# Altium footprint library LEMO THD_OLD.PcbLib: 54 footprints (part 4 of 4)
Each footprint in its own frame and in the unit in brackets; x right, y up, seen from the top. Pads: shape width x height; smd on the part's side, far side on the other; paste and mask are expansions set on the pad; w line width, h text height; cw(c..) or ccw(c..) is an arc to the next point about the centre after c.
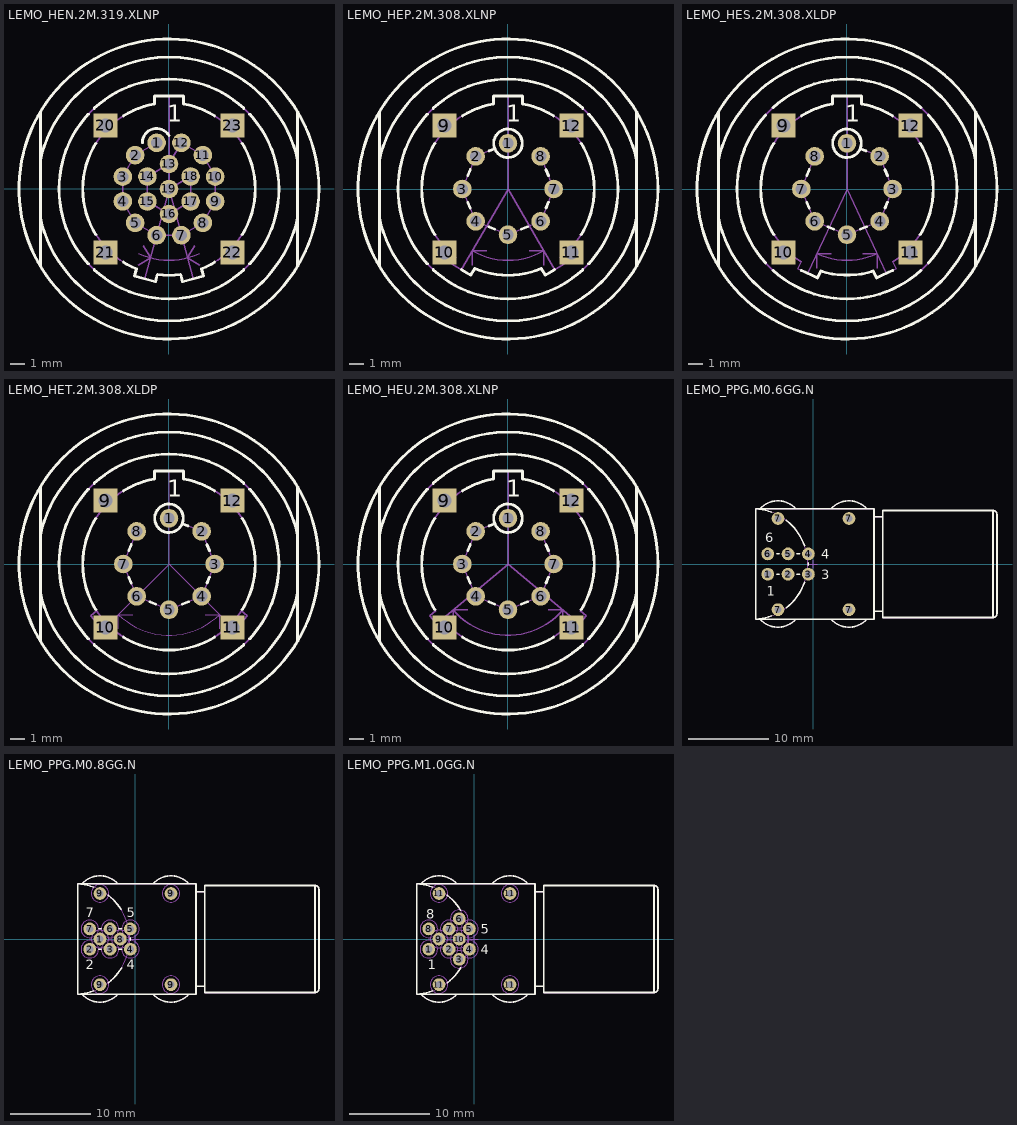
[diagram p3: the footprints below, top view; thin cyan lines are the x and y axes]

## LEMO_HEN.2M.319.XLNP [mm] "Size 2M, 19 Contacts Circular Watertight (IP 68) Receptacle, with Fixing Nut"
height 16.8
pads (23):
  round 1.3 hole 0.8: 1(-0.867,3.236) 2(-2.369,2.369) 3(-3.236,0.867) 4(-3.236,-0.867) 5(-2.369,-2.369) 6(-0.867,-3.236) 7(0.867,-3.236) 8(2.369,-2.369) 9(3.236,-0.867) 10(3.236,0.867) 11(2.369,2.369) 12(0.867,3.236) 13(0,1.75) 14(-1.516,0.875) 15(-1.516,-0.875) 16(0,-1.75) 17(1.516,-0.875) 18(1.516,0.875) 19(0,0)
  rect 1.7x1.7 hole 1: 20(-4.445,4.445) 21(-4.445,-4.445) 22(4.445,-4.445) 23(4.445,4.445)
Top Overlay:
  circle w0.2: c0,0 r10.5
  lines w0.2: -9,-5.408 -9,5.408 ; -9,-2.048 ccw(c0,0) 9,-2.048 ; -9,2.048 cw(c0,0) 9,2.048 ; -5.645,-5.237 cw(c0,0) -5.645,5.237 ; -5.237,-5.645 ccw(c0,0) 5.237,-5.645 ; -5.237,5.645 cw(c0,0) 5.237,5.645 ; -5.12,-3.195 cw(c0,0) -5.12,3.195 ; -3.195,-5.12 ccw(c0,0) -2.284,-5.586 -2.42,-6.096 -0.952,-6.49 -0.815,-5.98 ccw(c0,0) 0.815,-5.98 0.952,-6.49 2.42,-6.096 2.284,-5.586 ccw(c0,0) 3.195,-5.12 ; -3.195,5.12 cw(c0,0) -1.01,5.95 -1.01,6.515 1.01,6.515 1.01,5.95 cw(c0,0) 3.195,5.12 ; -1.867,3.234 cw(c-0.867,3.236) 0,3.734 ; 5.12,-3.195 ccw(c0,0) 5.12,3.195 ; 5.645,-5.237 ccw(c0,0) 5.645,5.237 ; 9,-5.408 9,5.408
  text "1" at -0.117,4.695 h1.2
Mechanical 2:
  text "BLUE" at -1.586,7.873 h1
Mechanical 8:
  lines w0.1: -4.945,-4.445 -4.445,-4.445 ; -4.945,4.445 -4.445,4.445 ; -4.445,-4.945 -4.445,-4.445 ; -4.445,-3.945 -4.445,-4.445 ; -4.445,3.945 -4.445,4.445 ; -4.445,4.945 -4.445,4.445 ; -3.945,-4.445 -4.445,-4.445 ; -3.945,4.445 -4.445,4.445 ; -3.736,-0.867 -3.236,-0.867 ; -3.736,0.867 -3.236,0.867 ; -3.236,-1.367 -3.236,-0.867 ; -3.236,-0.367 -3.236,-0.867 ; -3.236,0.367 -3.236,0.867 ; -3.236,1.367 -3.236,0.867 ; -2.869,-2.369 -2.369,-2.369 ; -2.869,2.369 -2.369,2.369 ; -2.736,-0.867 -3.236,-0.867 ; -2.736,0.867 -3.236,0.867 ; -2.369,-2.869 -2.369,-2.369 ; -2.369,-1.869 -2.369,-2.369 ; -2.369,1.869 -2.369,2.369 ; -2.369,2.869 -2.369,2.369 ; -2.16,-5.33 -1.294,-4.83 -1.794,-3.964 ; -2.113,-4.532 ccw(c0,0) 2.113,-4.532 ; -2.016,-0.875 -1.516,-0.875 ; -2.016,0.875 -1.516,0.875 ; -1.869,-2.369 -2.369,-2.369 ; -1.869,2.369 -2.369,2.369 ; -1.686,-6.293 0,0 ; -1.516,-1.375 -1.516,-0.875 ; -1.516,-0.375 -1.516,-0.875 ; -1.516,0.375 -1.516,0.875 ; -1.516,1.375 -1.516,0.875 ; -1.367,-3.236 -0.867,-3.236 ; -1.367,3.236 -0.867,3.236 ; -1.016,-0.875 -1.516,-0.875 ; -1.016,0.875 -1.516,0.875 ; -0.867,-3.736 -0.867,-3.236 ; -0.867,-2.736 -0.867,-3.236 ; -0.867,2.736 -0.867,3.236 ; -0.867,3.736 -0.867,3.236 ; -0.5,-1.75 0,-1.75 ; -0.5,0 0,0 ; -0.5,1.75 0,1.75 ; -0.367,-3.236 -0.867,-3.236 ; -0.367,3.236 -0.867,3.236 ; 0,-2.25 0,-1.75 ; 0,-1.25 0,-1.75 ; 0,-0.5 0,0 ; 0,0.5 0,0 ; 0,1.25 0,1.75 ; 0,2.25 0,1.75 ; 0,6.515 0,0 ; 0.367,-3.236 0.867,-3.236 ; 0.367,3.236 0.867,3.236 ; 0.5,-1.75 0,-1.75 ; 0.5,0 0,0 ; 0.5,1.75 0,1.75 ; 0.867,-3.736 0.867,-3.236 ; 0.867,-2.736 0.867,-3.236 ; 0.867,2.736 0.867,3.236 ; 0.867,3.736 0.867,3.236 ; 1.016,-0.875 1.516,-0.875 ; 1.016,0.875 1.516,0.875 ; 1.367,-3.236 0.867,-3.236 ; 1.367,3.236 0.867,3.236 ; 1.516,-1.375 1.516,-0.875 ; 1.516,-0.375 1.516,-0.875 ; 1.516,0.375 1.516,0.875 ; 1.516,1.375 1.516,0.875 ; 1.686,-6.293 0,0 ; 1.794,-3.964 1.294,-4.83 2.16,-5.33 ; 1.869,-2.369 2.369,-2.369 ; 1.869,2.369 2.369,2.369 ; 2.016,-0.875 1.516,-0.875 ; 2.016,0.875 1.516,0.875 ; 2.369,-2.869 2.369,-2.369 ; 2.369,-1.869 2.369,-2.369 ; 2.369,1.869 2.369,2.369 ; 2.369,2.869 2.369,2.369 ; 2.736,-0.867 3.236,-0.867 ; 2.736,0.867 3.236,0.867 ; 2.869,-2.369 2.369,-2.369 ; 2.869,2.369 2.369,2.369 ; 3.236,-1.367 3.236,-0.867 ; 3.236,-0.367 3.236,-0.867 ; 3.236,0.367 3.236,0.867 ; 3.236,1.367 3.236,0.867 ; 3.736,-0.867 3.236,-0.867 ; 3.736,0.867 3.236,0.867 ; 3.945,-4.445 4.445,-4.445 ; 3.945,4.445 4.445,4.445 ; 4.445,-4.945 4.445,-4.445 ; 4.445,-3.945 4.445,-4.445 ; 4.445,3.945 4.445,4.445 ; 4.445,4.945 4.445,4.445 ; 4.945,-4.445 4.445,-4.445 ; 4.945,4.445 4.445,4.445
  text "30" at -0.595,-4.879 h1
Mechanical 14:
  circle w0.1: c0,0 r0.55
  circle w0.1: c1.516,0.875 r0.55
  circle w0.1: c1.516,-0.875 r0.55
  circle w0.1: c0,-1.75 r0.55
  circle w0.1: c-1.516,-0.875 r0.55
  circle w0.1: c-1.516,0.875 r0.55
  circle w0.1: c0,1.75 r0.55
  circle w0.1: c0.867,3.236 r0.55
  circle w0.1: c2.369,2.369 r0.55
  circle w0.1: c3.236,0.867 r0.55
  circle w0.1: c3.236,-0.867 r0.55
  circle w0.1: c2.369,-2.369 r0.55
  circle w0.1: c0.867,-3.236 r0.55
  circle w0.1: c-0.867,-3.236 r0.55
  circle w0.1: c-2.369,-2.369 r0.55
  circle w0.1: c-3.236,-0.867 r0.55
  circle w0.1: c-3.236,0.867 r0.55
  circle w0.1: c-2.369,2.369 r0.55
  circle w0.1: c-0.867,3.236 r0.55
  circle w0.1: c0,0 r7.7
  circle w0.1: c0,0 r10.5
  lines w0.1: -9,-5.408 -9,5.408 ; -9,-2.048 ccw(c0,0) 9,-2.048 ; -9,2.048 cw(c0,0) 9,2.048 ; -3.236,-0.317 -3.236,0.317 ; -2.961,-1.343 -2.644,-1.893 ; -2.961,1.343 -2.644,1.892 ; -1.892,-2.644 -1.343,-2.961 ; -1.892,2.644 -1.343,2.961 ; -1.867,3.234 cw(c-0.867,3.236) 0,3.734 ; -1.516,-0.325 -1.516,0.325 ; -1.039,-1.15 -0.476,-1.475 ; -1.039,1.15 -0.476,1.475 ; -0.317,-3.236 0.317,-3.236 ; 0.277,2.225 0.59,2.761 ; 0.476,-1.475 1.039,-1.15 ; 0.476,0.275 1.039,0.6 ; 1.343,-2.961 1.892,-2.644 ; 1.343,2.961 1.892,2.644 ; 1.516,-0.325 1.516,0.325 ; 2.644,-1.893 2.961,-1.343 ; 2.644,1.892 2.961,1.343 ; 3.236,-0.317 3.236,0.317 ; 9,-5.408 9,5.408 ; -2.42,-6.096 -0.952,-6.49 -0.815,-5.98 ccw(c0,0) 0.815,-5.98 0.952,-6.49 2.42,-6.096 2.284,-5.586 ccw(c0,0) 1.01,5.95 1.01,6.515 -1.01,6.515 -1.01,5.95 ccw(c0,0) -2.284,-5.586 -2.42,-6.096
  text "1" at -0.117,4.695 h1.2
3D body "LEMO_HEN.2M.319.XLNP_Part2.stp": height 11.5, standoff 8.3, extent -10.5,-10.5 10.5,10.5
3D body "LEMO_HEN.2M.319.XLNP_Part1.stp": height 16.8, standoff -4, extent -10.4,-10.4 10.4,10.4

## LEMO_HEP.2M.308.XLNP [mm] "Size 2M, 8 Contacts Circular Watertight (IP 68) Receptacle, with Fixing Nut"
height 16.8
pads (12):
  round 1.3 hole 0.8: 1(0,3.2) 2(-2.263,2.286) 3(-3.2,0) 4(-2.263,-2.263) 5(0,-3.2) 6(2.286,-2.263) 7(3.2,0) 8(2.286,2.286)
  rect 1.7x1.7 hole 1: 9(-4.445,4.445) 10(-4.445,-4.445) 11(4.445,-4.445) 12(4.445,4.445)
Top Overlay:
  circle w0.2: c0,0 r10.5
  circle w0.2: c0,3.2 r1
  lines w0.2: -9,-5.408 -9,5.408 ; -9,-2.048 ccw(c0,0) 9,-2.048 ; -9,2.048 cw(c0,0) 9,2.048 ; -5.645,-5.237 cw(c0,0) -5.645,5.237 ; -5.237,-5.645 ccw(c0,0) 5.237,-5.645 ; -5.237,5.645 cw(c0,0) 5.237,5.645 ; -5.12,-3.195 cw(c0,0) -5.12,3.195 ; -3.257,-5.642 -2.599,-6.022 -2.335,-5.565 ccw(c0,0) 2.335,-5.565 2.599,-6.022 3.258,-5.642 ; -3.195,5.12 cw(c0,0) -1.01,5.95 -1.01,6.515 1.01,6.515 1.01,5.95 cw(c0,0) 3.195,5.12 ; -2.821,0.925 -2.642,1.361 ; -2.817,-0.924 -2.645,-1.339 ; -1.339,-2.645 -0.924,-2.817 ; -1.335,2.661 -0.927,2.826 ; 0.925,-2.821 1.361,-2.642 ; 2.657,1.358 2.829,0.928 ; 2.661,-1.336 2.826,-0.927 ; 5.12,-3.195 ccw(c0,0) 5.12,3.195 ; 5.645,-5.237 ccw(c0,0) 5.645,5.237 ; 9,-5.408 9,5.408
  text "1" at -0.117,4.695 h1.2
Mechanical 8:
  lines w0.1: -4.945,-4.445 -4.445,-4.445 ; -4.945,4.445 -4.445,4.445 ; -4.445,-4.945 -4.445,-4.445 ; -4.445,-3.945 -4.445,-4.445 ; -4.445,3.945 -4.445,4.445 ; -4.445,4.945 -4.445,4.445 ; -3.945,-4.445 -4.445,-4.445 ; -3.945,4.445 -4.445,4.445 ; -3.7,0 -3.2,0 ; -3.257,-5.642 0,0 ; -3.2,-0.5 -3.2,0 ; -3.2,0.5 -3.2,0 ; -2.763,-2.263 -2.263,-2.263 ; -2.763,2.286 -2.263,2.286 ; -2.7,0 -3.2,0 ; -2.5,-5.33 -2.5,-4.33 ; -2.263,-2.763 -2.263,-2.263 ; -2.263,-1.763 -2.263,-2.263 ; -2.263,1.786 -2.263,2.286 ; -2.263,2.786 -2.263,2.286 ; -1.763,-2.263 -2.263,-2.263 ; -1.763,2.286 -2.263,2.286 ; -1.5,-4.33 -2.5,-4.33 ; -0.5,-3.2 0,-3.2 ; -0.5,3.2 0,3.2 ; 0,-3.7 0,-3.2 ; 0,-2.7 0,-3.2 ; 0,2.7 0,3.2 ; 0,3.7 0,3.2 ; 0,6.515 0,0 ; 0.5,-3.2 0,-3.2 ; 0.5,3.2 0,3.2 ; 1.5,-4.33 2.5,-4.33 ; 1.786,-2.263 2.286,-2.263 ; 1.786,2.286 2.286,2.286 ; 2.286,-2.763 2.286,-2.263 ; 2.286,-1.763 2.286,-2.263 ; 2.286,1.786 2.286,2.286 ; 2.286,2.786 2.286,2.286 ; 2.5,-5.33 2.5,-4.33 ; 2.7,0 3.2,0 ; 2.786,-2.263 2.286,-2.263 ; 2.786,2.286 2.286,2.286 ; 3.2,-0.5 3.2,0 ; 3.2,0.5 3.2,0 ; 3.258,-5.642 0,0 ; 3.7,0 3.2,0 ; 3.945,-4.445 4.445,-4.445 ; 3.945,4.445 4.445,4.445 ; 4.445,-4.945 4.445,-4.445 ; 4.445,-3.945 4.445,-4.445 ; 4.445,3.945 4.445,4.445 ; 4.445,4.945 4.445,4.445 ; 4.945,-4.445 4.445,-4.445 ; 4.945,4.445 4.445,4.445 ; -2.5,-4.33 ccw(c0,0) 2.5,-4.33
  text "60" at -0.75,-4.9 h1
Mechanical 14:
  circle w0.1: c0,0 r10.5
  circle w0.1: c0,0 r7.7
  circle w0.1: c0,3.2 r1
  circle w0.1: c-2.263,2.286 r0.55
  circle w0.1: c-3.2,0 r0.55
  circle w0.1: c-2.263,-2.263 r0.55
  circle w0.1: c0,-3.2 r0.55
  circle w0.1: c2.286,-2.263 r0.55
  circle w0.1: c3.2,0 r0.55
  circle w0.1: c2.286,2.286 r0.55
  lines w0.1: -9,-5.408 -9,5.408 ; -9,-2.048 ccw(c0,0) 9,-2.048 ; -9,2.048 cw(c0,0) 9,2.048 ; -2.991,0.509 -2.471,1.777 ; -2.989,-0.508 -2.473,-1.755 ; -1.755,-2.473 -0.508,-2.99 ; -1.753,2.492 -0.927,2.826 ; 0.509,-2.991 1.777,-2.471 ; 2.49,1.775 2.996,0.511 ; 2.492,-1.753 2.994,-0.51 ; 9,-5.408 9,5.408 ; -3.916,-5.262 -3.652,-4.805 cw(c0,0) -1.01,5.95 -1.01,6.515 1.01,6.515 1.01,5.95 cw(c0,0) 3.652,-4.805 3.916,-5.262 2.599,-6.022 2.335,-5.565 cw(c0,0) -2.335,-5.565 -2.599,-6.022 -3.916,-5.262
  text "YELLOW" at -2.536,7.873 h0.8
  text "1" at -0.117,4.695 h1.2
3D body "LEMO_HEP.2M.308.XLNP_Part1.stp": height 16.8, standoff -4, extent -10.4,-10.4 10.4,10.4
3D body "LEMO_HEP.2M.308.XLNP_Part2.stp": height 11.5, standoff 8.3, extent -10.5,-10.5 10.5,10.5

## LEMO_HES.2M.308.XLDP [mm] "Size 2M, 8 Female Contacts Circular Watertight (IP 68) Receptacle, with Fixing Nut"
height 16.8
pads (12):
  round 1.3 hole 0.8: 1(0,3.2) 2(2.286,2.286) 3(3.2,0) 4(2.286,-2.263) 5(0,-3.2) 6(-2.263,-2.263) 7(-3.2,0) 8(-2.263,2.286)
  rect 1.7x1.7 hole 1: 9(-4.445,4.445) 10(-4.445,-4.445) 11(4.445,-4.445) 12(4.445,4.445)
Top Overlay:
  circle w0.2: c0,3.2 r1
  circle w0.2: c0,0 r10.5
  lines w0.2: -9,-5.408 -9,5.408 ; -9,-2.048 ccw(c0,0) 9,-2.048 ; -9,2.048 cw(c0,0) 9,2.048 ; -5.695,-5.182 cw(c0,0) -5.695,5.182 ; -5.182,-5.695 ccw(c0,0) 5.182,-5.695 ; -5.182,5.695 cw(c0,0) 5.182,5.695 ; -5.12,-3.195 cw(c0,0) -5.12,3.195 ; -3.203,-5.695 -2.065,-6.226 -1.841,-5.747 ccw(c0,0) 1.841,-5.747 2.065,-6.226 3.203,-5.695 ; -3.195,5.12 cw(c0,0) -1.01,5.95 -1.01,6.515 1.01,6.515 1.01,5.95 cw(c0,0) 3.195,5.12 ; -2.821,0.925 -2.642,1.361 ; -2.817,-0.924 -2.645,-1.339 ; -1.339,-2.645 -0.924,-2.817 ; 0.925,-2.821 1.361,-2.642 ; 0.927,2.826 1.336,2.661 ; 2.657,1.358 2.829,0.928 ; 2.661,-1.336 2.826,-0.927 ; 5.12,-3.195 ccw(c0,0) 5.12,3.195 ; 5.695,-5.182 ccw(c0,0) 5.695,5.182 ; 9,-5.408 9,5.408
  text "1" at -0.117,4.695 h1.2
Mechanical 2:
  text "RED" at -1.264,7.873 h1
Mechanical 8:
  lines w0.1: -4.945,-4.445 -4.445,-4.445 ; -4.945,4.445 -4.445,4.445 ; -4.445,-4.945 -4.445,-4.445 ; -4.445,-3.945 -4.445,-4.445 ; -4.445,3.945 -4.445,4.445 ; -4.445,4.945 -4.445,4.445 ; -3.945,-4.445 -4.445,-4.445 ; -3.945,4.445 -4.445,4.445 ; -3.7,0 -3.2,0 ; -3.2,-0.5 -3.2,0 ; -3.2,0.5 -3.2,0 ; -2.763,-2.263 -2.263,-2.263 ; -2.763,2.286 -2.263,2.286 ; -2.753,-5.905 0,0 ; -2.7,0 -3.2,0 ; -2.263,-2.763 -2.263,-2.263 ; -2.263,-1.763 -2.263,-2.263 ; -2.263,1.786 -2.263,2.286 ; -2.263,2.786 -2.263,2.286 ; -2.113,-5.532 -2.113,-4.532 ; -1.763,-2.263 -2.263,-2.263 ; -1.763,2.286 -2.263,2.286 ; -1.113,-4.532 -2.113,-4.532 ; -0.5,-3.2 0,-3.2 ; -0.5,3.2 0,3.2 ; 0,-3.7 0,-3.2 ; 0,-2.7 0,-3.2 ; 0,2.7 0,3.2 ; 0,3.7 0,3.2 ; 0,6.515 0,0 ; 0.5,-3.2 0,-3.2 ; 0.5,3.2 0,3.2 ; 1.113,-4.532 2.113,-4.532 ; 1.786,-2.263 2.286,-2.263 ; 1.786,2.286 2.286,2.286 ; 2.113,-5.532 2.113,-4.532 ; 2.286,-2.763 2.286,-2.263 ; 2.286,-1.763 2.286,-2.263 ; 2.286,1.786 2.286,2.286 ; 2.286,2.786 2.286,2.286 ; 2.7,0 3.2,0 ; 2.753,-5.905 0,0 ; 2.786,-2.263 2.286,-2.263 ; 2.786,2.286 2.286,2.286 ; 3.2,-0.5 3.2,0 ; 3.2,0.5 3.2,0 ; 3.7,0 3.2,0 ; 3.945,-4.445 4.445,-4.445 ; 3.945,4.445 4.445,4.445 ; 4.445,-4.945 4.445,-4.445 ; 4.445,-3.945 4.445,-4.445 ; 4.445,3.945 4.445,4.445 ; 4.445,4.945 4.445,4.445 ; 4.945,-4.445 4.445,-4.445 ; 4.945,4.445 4.445,4.445 ; -2.113,-4.532 ccw(c0,0) 2.113,-4.532
  text "50" at -0.595,-4.879 h1
Mechanical 14:
  circle w0.1: c2.286,2.286 r0.55
  circle w0.1: c3.2,0 r0.55
  circle w0.1: c2.286,-2.263 r0.55
  circle w0.1: c0,-3.2 r0.55
  circle w0.1: c-2.263,-2.263 r0.55
  circle w0.1: c-3.2,0 r0.55
  circle w0.1: c-2.263,2.286 r0.55
  circle w0.1: c0,3.2 r1
  circle w0.1: c0,0 r7.7
  circle w0.1: c0,0 r10.5
  lines w0.1: -9,-5.408 -9,5.408 ; -9,-2.048 ccw(c0,0) 9,-2.048 ; -9,2.048 cw(c0,0) 9,2.048 ; -2.991,0.509 -2.471,1.777 ; -2.989,-0.508 -2.473,-1.755 ; -1.755,-2.473 -0.508,-2.99 ; 0.509,-2.991 1.777,-2.471 ; 0.815,-5.98 cw(c0,0) -1.841,-5.747 -2.065,-6.226 -3.442,-5.583 -3.219,-5.105 cw(c0,0) -1.01,5.95 -1.01,6.515 1.01,6.515 1.01,5.95 cw(c0,0) 3.219,-5.105 3.442,-5.583 2.065,-6.226 1.841,-5.747 ; 0.927,2.826 1.753,2.492 ; 2.49,1.775 2.996,0.511 ; 2.492,-1.753 2.994,-0.51 ; 9,-5.408 9,5.408
  text "1" at -0.117,4.695 h1.2
3D body "LEMO_HES.2M.308.XLDP_Part1.stp": height 16.8, standoff -4, extent -10.4,-10.4 10.4,10.4
3D body "LEMO_HES.2M.308.XLDP_Part2.stp": height 11.5, standoff 8.3, extent -10.5,-10.5 10.5,10.5

## LEMO_HET.2M.308.XLDP [mm] "Size 2M, 8 Contacts Circular Watertight (IP 68) Receptacle, with Fixing Nut"
height 16.8
pads (12):
  round 1.3 hole 0.8: 1(0,3.2) 2(2.286,2.286) 3(3.2,0) 4(2.286,-2.263) 5(0,-3.2) 6(-2.263,-2.263) 7(-3.2,0) 8(-2.263,2.286)
  rect 1.7x1.7 hole 1: 9(-4.445,4.445) 10(-4.445,-4.445) 11(4.445,-4.445) 12(4.445,4.445)
Top Overlay:
  circle w0.2: c0,3.2 r1
  circle w0.2: c0,0 r10.5
  lines w0.2: -9,-5.408 -9,5.408 ; -9,-2.048 ccw(c0,0) 9,-2.048 ; -9,2.048 cw(c0,0) 9,2.048 ; -5.645,-5.237 cw(c0,0) -5.645,5.237 ; -5.237,5.645 cw(c0,0) 5.237,5.645 ; -5.12,-3.195 cw(c0,0) -5.12,3.195 ; -3.195,5.12 cw(c0,0) -1.01,5.95 -1.01,6.515 1.01,6.515 1.01,5.95 cw(c0,0) 3.195,5.12 ; -3.193,-5.116 ccw(c0,0.035) 3.193,-5.116 ; -2.821,0.925 -2.642,1.361 ; -2.817,-0.924 -2.645,-1.339 ; -1.339,-2.645 -0.924,-2.817 ; 0.925,-2.821 1.361,-2.642 ; 0.927,2.826 1.336,2.661 ; 2.657,1.358 2.829,0.928 ; 2.661,-1.336 2.826,-0.927 ; 5.12,-3.195 ccw(c0,0) 5.12,3.195 ; 9,-5.408 9,5.408 ; -5.237,-5.645 ccw(c0,0) 5.237,-5.645 cw(c0,0) -5.237,-5.645 ; 5.645,-5.237 ccw(c0,0) 5.645,5.237 cw(c0,0) 5.645,-5.237
  text "1" at -0.117,4.695 h1.2
Mechanical 2:
  text "ORANGE" at -2.3,7.9 h0.8
Mechanical 8:
  lines w0.05: -4.945,-4.445 -4.445,-4.445 ; -4.945,4.445 -4.445,4.445 ; -4.607,-4.607 0,0 ; -4.445,-4.945 -4.445,-4.445 ; -4.445,-3.945 -4.445,-4.445 ; -4.445,3.945 -4.445,4.445 ; -4.445,4.945 -4.445,4.445 ; -3.945,-4.445 -4.445,-4.445 ; -3.945,4.445 -4.445,4.445 ; -3.7,0 -3.2,0 ; -3.536,-4.536 -3.536,-3.536 ; -3.2,-0.5 -3.2,0 ; -3.2,0.5 -3.2,0 ; -2.763,-2.263 -2.263,-2.263 ; -2.763,2.286 -2.263,2.286 ; -2.7,0 -3.2,0 ; -2.536,-3.536 -3.536,-3.536 ; -2.263,-2.763 -2.263,-2.263 ; -2.263,-1.763 -2.263,-2.263 ; -2.263,1.786 -2.263,2.286 ; -2.263,2.786 -2.263,2.286 ; -1.763,-2.263 -2.263,-2.263 ; -1.763,2.286 -2.263,2.286 ; -0.5,-3.2 0,-3.2 ; -0.5,3.2 0,3.2 ; 0,-3.7 0,-3.2 ; 0,-2.7 0,-3.2 ; 0,2.7 0,3.2 ; 0,3.7 0,3.2 ; 0,6.515 0,0 ; 0.5,-3.2 0,-3.2 ; 0.5,3.2 0,3.2 ; 1.786,-2.263 2.286,-2.263 ; 1.786,2.286 2.286,2.286 ; 2.286,-2.763 2.286,-2.263 ; 2.286,-1.763 2.286,-2.263 ; 2.286,1.786 2.286,2.286 ; 2.286,2.786 2.286,2.286 ; 2.536,-3.536 3.536,-3.536 ; 2.7,0 3.2,0 ; 2.786,-2.263 2.286,-2.263 ; 2.786,2.286 2.286,2.286 ; 3.2,-0.5 3.2,0 ; 3.2,0.5 3.2,0 ; 3.536,-4.536 3.536,-3.536 ; 3.7,0 3.2,0 ; 3.945,-4.445 4.445,-4.445 ; 3.945,4.445 4.445,4.445 ; 4.445,-4.945 4.445,-4.445 ; 4.445,-3.945 4.445,-4.445 ; 4.445,3.945 4.445,4.445 ; 4.445,4.945 4.445,4.445 ; 4.607,-4.607 0,0 ; 4.945,-4.445 4.445,-4.445 ; 4.945,4.445 4.445,4.445 ; -3.536,-3.536 ccw(c0,0) 3.536,-3.536
  text "90" at -0.578,-4.879 h1
Mechanical 14:
  circle w0.1: c2.286,2.286 r0.55
  circle w0.1: c3.2,0 r0.55
  circle w0.1: c2.286,-2.263 r0.55
  circle w0.1: c0,-3.2 r0.55
  circle w0.1: c-2.263,-2.263 r0.55
  circle w0.1: c-3.2,0 r0.55
  circle w0.1: c-2.263,2.286 r0.55
  circle w0.1: c0,3.2 r1
  circle w0.1: c0,0 r7.7
  circle w0.1: c0,0 r10.5
  lines w0.1: -9,-5.408 -9,5.408 ; -9,-2.048 ccw(c0,0) 9,-2.048 ; -9,2.048 cw(c0,0) 9,2.048 ; -2.991,0.509 -2.471,1.777 ; -2.989,-0.508 -2.473,-1.755 ; -1.755,-2.473 -0.508,-2.99 ; 0.509,-2.991 1.777,-2.471 ; 0.927,2.826 1.753,2.492 ; 2.49,1.775 2.996,0.511 ; 2.492,-1.753 2.994,-0.51 ; 9,-5.408 9,5.408 ; -1.01,5.95 ccw(c0,0) -4.771,-3.696 -5.144,-4.069 -4.069,-5.144 -3.696,-4.771 ccw(c0,0.012) 3.696,-4.771 4.069,-5.144 5.144,-4.069 4.771,-3.696 ccw(c0,0) 1.01,5.95 ; -1.01,5.95 ccw(c0,0) -5.075,-3.266 -5.479,-3.606 -4.502,-4.77 -4.098,-4.431 ccw(c0,0.01) 4.098,-4.431 4.502,-4.77 5.479,-3.606 5.075,-3.266 ccw(c0,0) 1.01,5.95 ; -1.01,5.95 -1.01,6.515 ; -1.01,5.95 -1.01,6.515 ; -1.01,6.515 1.01,6.515 ; -1.01,6.515 1.01,6.515 ; 1.01,5.95 1.01,6.515 ; 1.01,5.95 1.01,6.515
  text "1" at -0.117,4.695 h1.2
3D body "LEMO_HET.2M.308.XLDP_part2.stp": height 11.5, standoff 8.3, extent -10.5,-10.5 10.5,10.5
3D body "LEMO_HET.2M.308.XLDP_part1.stp": height 16.8, standoff -4, extent -10.4,-10.4 10.4,10.4

## LEMO_HEU.2M.308.XLNP [mm] "Size 2M, 8 Contacts Circular Watertight (IP 68) Receptacle, with Fixing Nut"
height 16.8
pads (12):
  round 1.3 hole 0.8: 1(0,3.2) 2(-2.263,2.286) 3(-3.2,0) 4(-2.263,-2.263) 5(0,-3.2) 6(2.286,-2.263) 7(3.2,0) 8(2.286,2.286)
  rect 1.7x1.7 hole 1: 9(-4.445,4.445) 10(-4.445,-4.445) 11(4.445,-4.445) 12(4.445,4.445)
Top Overlay:
  circle w0.2: c0,3.2 r1
  circle w0.2: c0,0 r10.5
  lines w0.2: -9,-5.408 -9,5.408 ; -9,-2.048 ccw(c0,0) 9,-2.048 ; -9,2.048 cw(c0,0) 9,2.048 ; -5.645,-5.237 cw(c0,0) -5.645,5.237 ; -5.237,-5.645 ccw(c0,0) 5.237,-5.645 ; -5.237,5.645 cw(c0,0) 5.237,5.645 ; -5.12,-3.195 cw(c0,0) -5.12,3.195 ; -3.195,5.12 cw(c0,0) -1.01,5.95 -1.01,6.515 1.01,6.515 1.01,5.95 cw(c0,0) 3.195,5.12 ; -3.193,-5.116 ccw(c0,0.035) 3.193,-5.116 ; -2.821,0.925 -2.642,1.361 ; -2.817,-0.924 -2.645,-1.339 ; -1.339,-2.645 -0.924,-2.817 ; -1.336,2.661 -0.927,2.826 ; 0.925,-2.821 1.361,-2.642 ; 2.657,1.358 2.829,0.928 ; 2.661,-1.336 2.826,-0.927 ; 5.12,-3.195 ccw(c0,0) 5.12,3.195 ; 5.645,-5.237 ccw(c0,0) 5.645,5.237 ; 9,-5.408 9,5.408
  text "1" at -0.117,4.695 h1.2
Mechanical 8:
  lines w0.1: -4.991,-4.188 0,0 ; -4.945,-4.445 -4.445,-4.445 ; -4.945,4.445 -4.445,4.445 ; -4.445,-4.945 -4.445,-4.445 ; -4.445,-3.945 -4.445,-4.445 ; -4.445,3.945 -4.445,4.445 ; -4.445,4.945 -4.445,4.445 ; -3.945,-4.445 -4.445,-4.445 ; -3.945,4.445 -4.445,4.445 ; -3.83,-4.214 -3.83,-3.214 ; -3.7,0 -3.2,0 ; -3.2,-0.5 -3.2,0 ; -3.2,0.5 -3.2,0 ; -2.83,-3.214 -3.83,-3.214 ; -2.763,-2.263 -2.263,-2.263 ; -2.763,2.286 -2.263,2.286 ; -2.7,0 -3.2,0 ; -2.263,-2.763 -2.263,-2.263 ; -2.263,-1.763 -2.263,-2.263 ; -2.263,1.786 -2.263,2.286 ; -2.263,2.786 -2.263,2.286 ; -1.763,-2.263 -2.263,-2.263 ; -1.763,2.286 -2.263,2.286 ; -0.5,-3.2 0,-3.2 ; -0.5,3.2 0,3.2 ; 0,-3.7 0,-3.2 ; 0,-2.7 0,-3.2 ; 0,2.7 0,3.2 ; 0,3.7 0,3.2 ; 0,6.515 0,0 ; 0.5,-3.2 0,-3.2 ; 0.5,3.2 0,3.2 ; 1.786,-2.263 2.286,-2.263 ; 1.786,2.286 2.286,2.286 ; 2.286,-2.763 2.286,-2.263 ; 2.286,-1.763 2.286,-2.263 ; 2.286,1.786 2.286,2.286 ; 2.286,2.786 2.286,2.286 ; 2.7,0 3.2,0 ; 2.786,-2.263 2.286,-2.263 ; 2.786,2.286 2.286,2.286 ; 2.83,-3.214 3.83,-3.214 ; 3.2,-0.5 3.2,0 ; 3.2,0.5 3.2,0 ; 3.7,0 3.2,0 ; 3.83,-4.214 3.83,-3.214 ; 3.945,-4.445 4.445,-4.445 ; 3.945,4.445 4.445,4.445 ; 4.445,-4.945 4.445,-4.445 ; 4.445,-3.945 4.445,-4.445 ; 4.445,3.945 4.445,4.445 ; 4.445,4.945 4.445,4.445 ; 4.945,-4.445 4.445,-4.445 ; 4.945,4.445 4.445,4.445 ; 4.991,-4.188 0,0 ; -3.83,-3.214 ccw(c0,0) 3.83,-3.214
  text "100" at -1.2,-4.85 h1
Mechanical 14:
  circle w0.1: c2.286,2.286 r0.55
  circle w0.1: c3.2,0 r0.55
  circle w0.1: c2.286,-2.263 r0.55
  circle w0.1: c0,-3.2 r0.55
  circle w0.1: c-2.263,-2.263 r0.55
  circle w0.1: c-3.2,0 r0.55
  circle w0.1: c-2.263,2.286 r0.55
  circle w0.1: c0,3.2 r1
  circle w0.1: c0,0 r7.7
  circle w0.1: c0,0 r10.5
  lines w0.1: -9,-5.408 -9,5.408 ; -9,-2.048 ccw(c0,0) 9,-2.048 ; -9,2.048 cw(c0,0) 9,2.048 ; -2.991,0.509 -2.471,1.777 ; -2.989,-0.508 -2.473,-1.755 ; -1.755,-2.473 -0.508,-2.99 ; -1.753,2.492 -0.927,2.826 ; 0.509,-2.991 1.777,-2.471 ; 2.49,1.775 2.996,0.511 ; 2.492,-1.753 2.994,-0.51 ; 9,-5.408 9,5.408 ; -5.479,-3.606 -4.502,-4.77 -4.098,-4.431 ccw(c0,0.01) 4.098,-4.431 4.502,-4.77 5.479,-3.606 5.075,-3.266 ccw(c0,0) 1.01,5.95 1.01,6.515 -1.01,6.515 -1.01,5.95 ccw(c0,0) -5.075,-3.266 -5.479,-3.606
  text "1" at -0.117,4.695 h1.2
  text "GREEN" at -2.25,7.95 h1
3D body "LEMO_HEU.2M.308.XLNP_Part2.stp": height 11.5, standoff 8.3, extent -10.5,-10.5 10.5,10.5
3D body "LEMO_HEU.2M.308.XLNP_Part1.stp": height 16.8, standoff -4, extent -10.4,-10.4 10.4,10.4

## LEMO_PPG.M0.6GG.N [mm] "Size P, Elbow Receptacle (90°) With 6 Female Contacts and Alignment Key (G)"
height 14.5
pads (10):
  round 1.6 hole 0.9: 1(-5.715,-1.27) 2(-3.175,-1.27) 3(-0.635,-1.27) 4(-0.635,1.27) 5(-3.175,1.27) 6(-5.715,1.27) 7(-4.445,-5.71) 7(-4.445,5.71) 7(4.445,-5.71) 7(4.445,5.71)
Top Overlay:
  lines w0.2: -7.215,-6.907 ccw(c-7.497,-0.505) -5.217,-6.494 ; -7.215,6.917 cw(c-7.647,-0.001) -5.219,6.492 ; -6.672,-6.92 ccw(c-4.445,-4.91) -2.218,-6.92 ; -6.672,6.93 cw(c-4.445,4.92) -2.218,6.93 ; -4.615,-1.27 -4.275,-1.27 ; -4.615,1.27 -4.275,1.27 ; -3.374,-5.46 ccw(c-7.647,-0.001) -1.096,-2.269 ; -3.374,5.458 cw(c-7.647,-0.001) -1.097,2.268 ; -2.075,-1.27 -1.735,-1.27 ; -2.075,1.27 -1.735,1.27 ; -0.635,-0.17 -0.635,0.17 ; 2.218,-6.92 ccw(c4.446,-4.91) 6.673,-6.92 ; 2.219,6.93 cw(c4.445,4.921) 6.672,6.93 ; 7.585,-5.895 8.685,-5.895 ; 7.585,5.905 8.685,5.905 ; 22.485,-6.695 ccw(c22.485,-6.195) 22.985,-6.195 22.985,6.205 ccw(c22.485,6.205) 22.485,6.705 ; 22.485,-6.695 8.685,-6.695 8.685,6.705 22.485,6.705 ; 22.485,-6.695 22.485,6.705 ; -7.215,-6.918 7.585,-6.92 7.585,6.93 -7.215,6.93 -7.215,-6.918
  text "4" at 0.953,0.635 h1.2
  text "1" at -5.874,-3.969 h1.2
  text "3" at 0.953,-1.905 h1.2
  text "6" at -6.032,2.699 h1.2
Mechanical 8:
  lines w0.05: -6.215,-1.27 -5.715,-1.27 -5.715,-0.77 ; -6.215,1.27 -5.715,1.27 ; -5.715,0.77 -5.715,1.27 ; -5.715,1.77 -5.715,1.27 ; -5.215,1.27 -5.715,1.27 ; -4.945,-5.71 -4.445,-5.71 ; -4.945,5.71 -4.445,5.71 ; -4.445,-6.21 -4.445,-5.71 ; -4.445,-5.21 -4.445,-5.71 ; -4.445,5.21 -4.445,5.71 ; -4.445,6.21 -4.445,5.71 ; -3.945,-5.71 -4.445,-5.71 ; -3.945,5.71 -4.445,5.71 ; -3.675,-1.27 -3.175,-1.27 ; -3.675,1.27 -3.175,1.27 ; -3.175,-1.77 -3.175,-1.27 ; -3.175,-0.77 -3.175,-1.27 ; -3.175,0.77 -3.175,1.27 ; -3.175,1.77 -3.175,1.27 ; -2.675,-1.27 -3.175,-1.27 ; -2.675,1.27 -3.175,1.27 ; -1.135,-1.27 -0.635,-1.27 ; -1.135,1.27 -0.635,1.27 ; -0.635,-1.77 -0.635,-1.27 ; -0.635,-0.77 -0.635,-1.27 ; -0.635,0.77 -0.635,1.27 ; -0.635,1.77 -0.635,1.27 ; -0.5,0 0,0 ; -0.135,-1.27 -0.635,-1.27 ; -0.135,1.27 -0.635,1.27 ; 0,-0.5 0,0 ; 0,0.5 0,0 ; 0.5,0 0,0 ; 3.945,-5.71 4.445,-5.71 ; 3.945,5.71 4.445,5.71 ; 4.445,-6.21 4.445,-5.71 ; 4.445,-5.21 4.445,-5.71 ; 4.445,5.21 4.445,5.71 ; 4.445,6.21 4.445,5.71 ; 4.945,-5.71 4.445,-5.71 ; 4.945,5.71 4.445,5.71
Mechanical 14:
  lines w0.1: -7.215,-6.907 ccw(c-7.64,0.005) -7.215,6.917 ; -6.672,-6.92 ccw(c-4.445,-4.91) -2.218,-6.92 ; -6.672,6.93 cw(c-4.445,4.92) -2.218,6.93 ; 2.218,-6.92 ccw(c4.446,-4.91) 6.673,-6.92 ; 2.219,6.93 cw(c4.445,4.921) 6.672,6.93 ; 7.585,-5.895 8.685,-5.895 ; 7.585,5.905 8.685,5.905 ; 22.485,-6.695 ccw(c22.485,-6.195) 22.985,-6.195 22.985,6.205 ccw(c22.485,6.205) 22.485,6.705 ; 22.485,-6.695 8.685,-6.695 8.685,6.705 22.485,6.705 ; 22.485,-6.695 22.485,6.705 ; -7.215,-6.918 7.585,-6.92 7.585,6.93 -7.215,6.93 -7.215,-6.918
  text "4" at 0.953,0.635 h1.2
  text "1" at -5.874,-3.969 h1.2
  text "3" at 0.953,-1.905 h1.2
  text "6" at -6.032,2.699 h1.2
3D body "LEMO_PPG.M0.6GG.N.stp": height 14.5, standoff -3.3, extent -7.215,-7.92 22.985,7.91

## LEMO_PPG.M0.8GG.N [mm] "Size P, Elbow Receptacle (90°) With 8 Female Contacts and Alignment Key (G)"
height 14.5
pads (12):
  round 1.6 hole 0.9: 1(-4.445,0) 2(-5.715,-1.27) 3(-3.175,-1.27) 4(-0.635,-1.27) 5(-0.635,1.27) 6(-3.175,1.27) 7(-5.715,1.27) 8(-1.905,0) 9(-4.445,-5.71) 9(-4.445,5.71) 9(4.445,-5.71) 9(4.445,5.71)
Top Overlay:
  lines w0.2: -7.215,-6.907 ccw(c-7.497,-0.505) -5.217,-6.494 ; -7.215,6.917 cw(c-7.647,-0.001) -5.219,6.492 ; -6.672,-6.92 ccw(c-4.445,-4.91) -2.218,-6.92 ; -6.672,6.93 cw(c-4.445,4.92) -2.218,6.93 ; -4.615,-1.27 -4.275,-1.27 ; -4.615,1.27 -4.275,1.27 ; -3.374,-5.46 ccw(c-7.647,-0.001) -1.724,-3.603 ; -3.374,5.458 cw(c-7.647,-0.001) -1.798,3.719 ; -2.075,-1.27 -1.735,-1.27 ; -2.075,1.27 -1.735,1.27 ; -0.635,-0.17 -0.635,0.17 ; 2.218,-6.92 ccw(c4.446,-4.91) 6.673,-6.92 ; 2.219,6.93 cw(c4.445,4.921) 6.672,6.93 ; 7.585,-5.895 8.685,-5.895 ; 7.585,5.905 8.685,5.905 ; 22.485,-6.695 ccw(c22.485,-6.195) 22.985,-6.195 22.985,6.205 ccw(c22.485,6.205) 22.485,6.705 ; 22.485,-6.695 22.485,6.705 ; 22.485,-6.695 8.685,-6.695 8.685,6.705 22.485,6.705 ; -7.215,-6.918 -7.215,6.93 7.585,6.93 7.585,-6.92 -7.215,-6.918
  text "5" at -1.111,2.699 h1.2
  text "2" at -6.191,-3.81 h1.2
  text "4" at -1.111,-3.81 h1.2
  text "7" at -6.191,2.699 h1.2
Mechanical 8:
  circle w0.05: c-1.905,0 r1.1
  circle w0.05: c-4.445,0 r1.1
  circle w0.05: c-0.635,1.27 r1.1
  circle w0.05: c-0.635,-1.27 r1.1
  circle w0.05: c-5.715,-1.27 r1.1
  circle w0.05: c-3.175,-1.27 r1.1
  circle w0.05: c-3.175,1.27 r1.1
  circle w0.05: c-5.715,1.27 r1.1
  circle w0.05: c4.445,-5.71 r1.1
  circle w0.05: c-4.445,-5.71 r1.1
  circle w0.05: c4.445,5.71 r1.1
  circle w0.05: c-4.445,5.71 r1.1
  lines w0.05: -6.215,-1.27 -5.715,-1.27 -5.715,-0.77 ; -6.215,1.27 -5.715,1.27 ; -5.715,0.77 -5.715,1.27 ; -5.715,1.77 -5.715,1.27 ; -5.215,1.27 -5.715,1.27 ; -4.945,-5.71 -4.445,-5.71 ; -4.945,0 -4.445,0 ; -4.945,5.71 -4.445,5.71 ; -4.445,-6.21 -4.445,-5.71 ; -4.445,-5.21 -4.445,-5.71 ; -4.445,-0.5 -4.445,0 ; -4.445,0.5 -4.445,0 ; -4.445,5.21 -4.445,5.71 ; -4.445,6.21 -4.445,5.71 ; -3.945,-5.71 -4.445,-5.71 ; -3.945,0 -4.445,0 ; -3.945,5.71 -4.445,5.71 ; -3.675,-1.27 -3.175,-1.27 ; -3.675,1.27 -3.175,1.27 ; -3.175,-1.77 -3.175,-1.27 ; -3.175,-0.77 -3.175,-1.27 ; -3.175,0.77 -3.175,1.27 ; -3.175,1.77 -3.175,1.27 ; -2.675,-1.27 -3.175,-1.27 ; -2.675,1.27 -3.175,1.27 ; -2.405,0 -1.905,0 ; -1.905,-0.5 -1.905,0 ; -1.905,0.5 -1.905,0 ; -1.405,0 -1.905,0 ; -1.135,-1.27 -0.635,-1.27 ; -1.135,1.27 -0.635,1.27 ; -0.635,-1.77 -0.635,-1.27 ; -0.635,-0.77 -0.635,-1.27 ; -0.635,0.77 -0.635,1.27 ; -0.635,1.77 -0.635,1.27 ; -0.5,0 0,0 ; -0.135,-1.27 -0.635,-1.27 ; -0.135,1.27 -0.635,1.27 ; 0,-0.5 0,0 ; 0,0.5 0,0 ; 0.5,0 0,0 ; 3.945,-5.71 4.445,-5.71 ; 3.945,5.71 4.445,5.71 ; 4.445,-6.21 4.445,-5.71 ; 4.445,-5.21 4.445,-5.71 ; 4.445,5.21 4.445,5.71 ; 4.445,6.21 4.445,5.71 ; 4.945,-5.71 4.445,-5.71 ; 4.945,5.71 4.445,5.71
Mechanical 14:
  lines w0.1: -7.215,-6.907 ccw(c-7.64,0.005) -7.215,6.917 ; -6.672,-6.92 ccw(c-4.445,-4.91) -2.218,-6.92 ; -6.672,6.93 cw(c-4.445,4.92) -2.218,6.93 ; 2.218,-6.92 ccw(c4.446,-4.91) 6.673,-6.92 ; 2.219,6.93 cw(c4.445,4.921) 6.672,6.93 ; 7.585,-5.895 8.685,-5.895 ; 7.585,5.905 8.685,5.905 ; 22.485,-6.695 ccw(c22.485,-6.195) 22.985,-6.195 22.985,6.205 ccw(c22.485,6.205) 22.485,6.705 ; 22.485,-6.695 22.485,6.705 ; 22.485,-6.695 8.685,-6.695 8.685,6.705 22.485,6.705 ; -7.215,-6.918 -7.215,6.93 7.585,6.93 7.585,-6.92 -7.215,-6.918
  text "5" at -1.111,2.699 h1.2
  text "2" at -6.191,-3.81 h1.2
  text "4" at -1.111,-3.81 h1.2
  text "7" at -6.191,2.699 h1.2
3D body "LEMO_PPG.M0.8GG.N.stp": height 14.5, standoff -3.3, extent -7.215,-7.915 22.985,7.915

## LEMO_PPG.M1.0GG.N [mm] "Size P, Elbow Receptacle (90°) With 10 Female Contacts and Alignment Key (G)"
height 14.5
pads (14):
  round 1.6 hole 0.9: 1(-5.715,-1.27) 2(-3.175,-1.27) 3(-1.905,-2.54) 4(-0.635,-1.27) 5(-0.635,1.27) 6(-1.905,2.54) 7(-3.175,1.27) 8(-5.715,1.27) 9(-4.445,0) 10(-1.905,0) 11(-4.445,-5.71) 11(-4.445,5.71) 11(4.445,-5.71) 11(4.445,5.71)
Top Overlay:
  lines w0.2: -7.215,-6.907 ccw(c-7.497,-0.505) -5.217,-6.494 ; -7.215,6.917 cw(c-7.647,-0.001) -5.219,6.492 ; -6.672,-6.92 ccw(c-4.445,-4.91) -2.218,-6.92 ; -6.672,6.93 cw(c-4.445,4.92) -2.218,6.93 ; -3.374,-5.46 ccw(c-7.647,-0.001) -1.739,-3.627 ; -3.374,5.458 cw(c-7.647,-0.001) -1.741,3.628 ; 2.218,-6.92 ccw(c4.446,-4.91) 6.673,-6.92 ; 2.219,6.93 cw(c4.445,4.921) 6.672,6.93 ; 7.585,-5.895 8.685,-5.895 ; 7.585,5.905 8.685,5.905 ; 22.485,-6.695 ccw(c22.485,-6.195) 22.985,-6.195 22.985,6.205 ccw(c22.485,6.205) 22.485,6.705 ; 22.485,-6.695 22.485,6.705 ; 22.485,-6.695 8.685,-6.695 8.685,6.705 22.485,6.705 ; -7.215,-6.918 -7.215,6.93 7.585,6.93 7.585,-6.92 -7.215,-6.918
  text "8" at -6.032,2.54 h1.2
  text "4" at 0.794,-1.905 h1.2
  text "1" at -5.874,-3.81 h1.2
  text "5" at 0.794,0.635 h1.2
Mechanical 8:
  circle w0.05: c-1.905,-2.54 r1.1
  circle w0.05: c-1.905,2.54 r1.1
  circle w0.05: c-1.905,0 r1.1
  circle w0.05: c-4.445,0 r1.1
  circle w0.05: c-0.635,1.27 r1.1
  circle w0.05: c-0.635,-1.27 r1.1
  circle w0.05: c-5.715,-1.27 r1.1
  circle w0.05: c-3.175,-1.27 r1.1
  circle w0.05: c-3.175,1.27 r1.1
  circle w0.05: c-5.715,1.27 r1.1
  circle w0.05: c4.445,-5.71 r1.1
  circle w0.05: c-4.445,-5.71 r1.1
  circle w0.05: c4.445,5.71 r1.1
  circle w0.05: c-4.445,5.71 r1.1
  lines w0.05: -6.215,-1.27 -5.715,-1.27 -5.715,-0.77 ; -6.215,1.27 -5.715,1.27 ; -5.715,0.77 -5.715,1.27 ; -5.715,1.77 -5.715,1.27 ; -5.215,1.27 -5.715,1.27 ; -4.945,-5.71 -4.445,-5.71 ; -4.945,0 -4.445,0 ; -4.945,5.71 -4.445,5.71 ; -4.445,-6.21 -4.445,-5.71 ; -4.445,-5.21 -4.445,-5.71 ; -4.445,-0.5 -4.445,0 ; -4.445,0.5 -4.445,0 ; -4.445,5.21 -4.445,5.71 ; -4.445,6.21 -4.445,5.71 ; -3.945,-5.71 -4.445,-5.71 ; -3.945,0 -4.445,0 ; -3.945,5.71 -4.445,5.71 ; -3.675,-1.27 -3.175,-1.27 ; -3.675,1.27 -3.175,1.27 ; -3.175,-1.77 -3.175,-1.27 ; -3.175,-0.77 -3.175,-1.27 ; -3.175,0.77 -3.175,1.27 ; -3.175,1.77 -3.175,1.27 ; -2.675,-1.27 -3.175,-1.27 ; -2.675,1.27 -3.175,1.27 ; -2.405,-2.54 -1.905,-2.54 ; -2.405,0 -1.905,0 ; -2.405,2.54 -1.905,2.54 ; -1.905,-3.04 -1.905,-2.54 ; -1.905,-2.04 -1.905,-2.54 ; -1.905,-0.5 -1.905,0 ; -1.905,0.5 -1.905,0 ; -1.905,2.04 -1.905,2.54 ; -1.905,3.04 -1.905,2.54 ; -1.405,-2.54 -1.905,-2.54 ; -1.405,0 -1.905,0 ; -1.405,2.54 -1.905,2.54 ; -1.135,-1.27 -0.635,-1.27 ; -1.135,1.27 -0.635,1.27 ; -0.635,-1.77 -0.635,-1.27 ; -0.635,-0.77 -0.635,-1.27 ; -0.635,0.77 -0.635,1.27 ; -0.635,1.77 -0.635,1.27 ; -0.5,0 0,0 ; -0.135,-1.27 -0.635,-1.27 ; -0.135,1.27 -0.635,1.27 ; 0,-0.5 0,0 ; 0,0.5 0,0 ; 0.5,0 0,0 ; 3.945,-5.71 4.445,-5.71 ; 3.945,5.71 4.445,5.71 ; 4.445,-6.21 4.445,-5.71 ; 4.445,-5.21 4.445,-5.71 ; 4.445,5.21 4.445,5.71 ; 4.445,6.21 4.445,5.71 ; 4.945,-5.71 4.445,-5.71 ; 4.945,5.71 4.445,5.71
Mechanical 14:
  lines w0.1: -7.215,-6.907 ccw(c-7.64,0.005) -7.215,6.917 ; -6.672,-6.92 ccw(c-4.445,-4.91) -2.218,-6.92 ; -6.672,6.93 cw(c-4.445,4.92) -2.218,6.93 ; 2.218,-6.92 ccw(c4.446,-4.91) 6.673,-6.92 ; 2.219,6.93 cw(c4.445,4.921) 6.672,6.93 ; 7.585,-5.895 8.685,-5.895 ; 7.585,5.905 8.685,5.905 ; 22.485,-6.695 ccw(c22.485,-6.195) 22.985,-6.195 22.985,6.205 ccw(c22.485,6.205) 22.485,6.705 ; 22.485,-6.695 22.485,6.705 ; 22.485,-6.695 8.685,-6.695 8.685,6.705 22.485,6.705 ; -7.215,-6.918 -7.215,6.93 7.585,6.93 7.585,-6.92 -7.215,-6.918
  text "8" at -6.032,2.54 h1.2
  text "4" at 0.794,-1.905 h1.2
  text "1" at -5.874,-3.81 h1.2
  text "5" at 0.794,0.635 h1.2
3D body "LEMO_PPG.M1.0GG.N.stp": height 14.5, standoff -3.3, extent -7.215,-7.92 22.985,7.91